# Altium footprint library Main_Board.PcbLib: 107 footprints (part 5 of 7)
Each footprint in its own frame and in the unit in brackets; x right, y up, seen from the top. Pads: shape width x height; smd on the part's side, far side on the other; paste and mask are expansions set on the pad; w line width, h text height; cw(c..) or ccw(c..) is an arc to the next point about the centre after c.
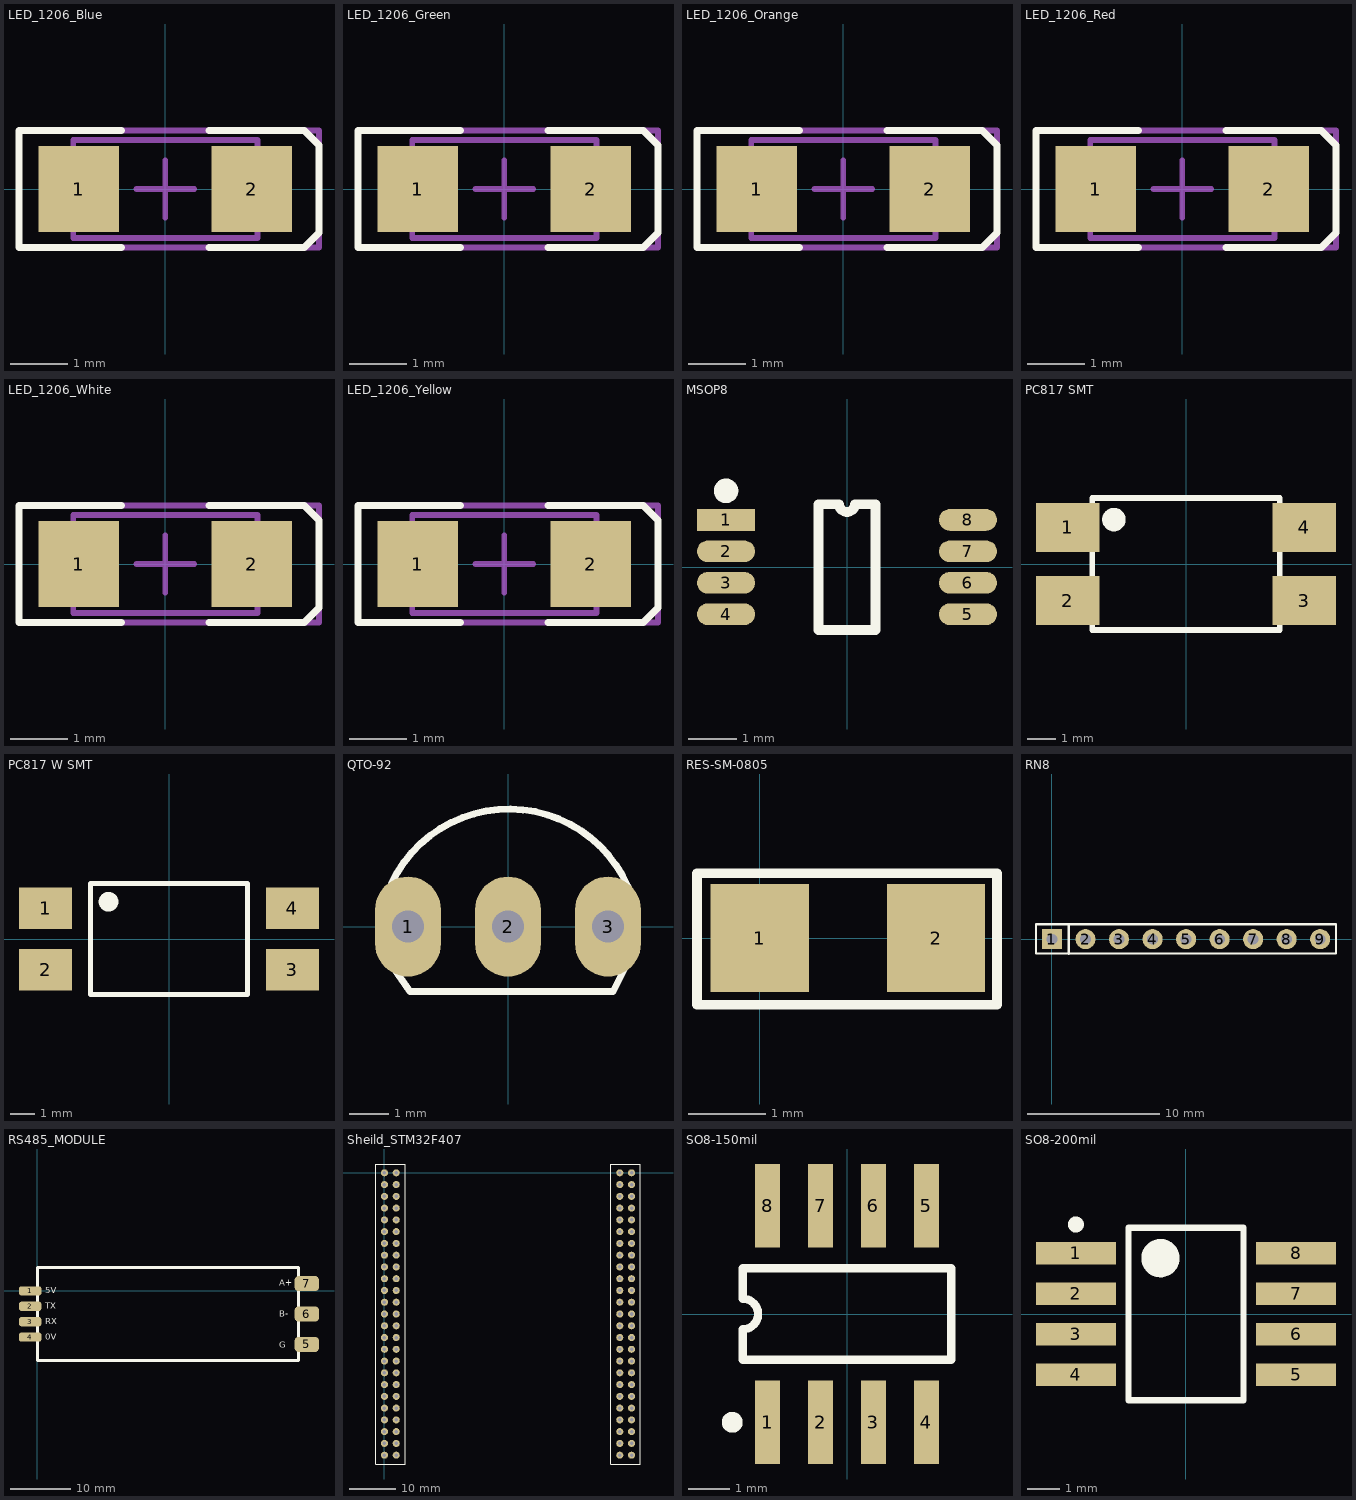
[diagram p4: the footprints below, top view; thin cyan lines are the x and y axes]

## LED_1206_Blue [mm] "Chip LED, 2-Leads, Body 3.2x1.6mm, IPC Medium Density"
height 0.69
pads (2):
  rect 1.4x1.5 smd: 1(-1.5,0) 2(1.5,0)
Top Overlay:
  lines w0.127: -0.762,-1.016 -2.54,-1.016 -2.54,1.016 -0.762,1.016 ; 0.762,-1.016 2.413,-1.016 2.667,-0.762 2.667,0.762 2.413,1.016 0.762,1.016
Mechanical 13:
  lines w0.1: -1.6,-0.85 -1.6,0.85 1.6,0.85 1.6,-0.85 -1.6,-0.85
Mechanical 15:
  lines w0.1: -0.5,0 0.5,0 ; 0,-0.5 0,0.5 ; -2.54,-1.016 -2.54,1.016 2.667,1.016 2.667,-1.016 -2.54,-1.016
3D body "User Library-led_1206-blue.step": height 1.1, standoff 0, extent -1.61,-0.8 1.61,0.8

## LED_1206_Green [mm] "Chip LED, 2-Leads, Body 3.2x1.6mm, IPC Medium Density"
height 0.69
pads (2):
  rect 1.4x1.5 smd: 1(-1.5,0) 2(1.5,0)
Top Overlay:
  lines w0.127: -0.762,-1.016 -2.54,-1.016 -2.54,1.016 -0.762,1.016 ; 0.762,-1.016 2.413,-1.016 2.667,-0.762 2.667,0.762 2.413,1.016 0.762,1.016
Mechanical 13:
  lines w0.1: -1.6,-0.85 1.6,-0.85 1.6,0.85 -1.6,0.85 -1.6,-0.85
Mechanical 15:
  lines w0.1: -0.5,0 0.5,0 ; 0,-0.5 0,0.5 ; -2.54,-1.016 2.667,-1.016 2.667,1.016 -2.54,1.016 -2.54,-1.016
3D body "User Library-led_1206-green.step": height 1.1, standoff 0, extent -1.61,-0.8 1.61,0.8

## LED_1206_Orange [mm] "Chip LED, 2-Leads, Body 3.2x1.6mm, IPC Medium Density"
height 0.69
pads (2):
  rect 1.4x1.5 smd: 1(-1.5,0) 2(1.5,0)
Top Overlay:
  lines w0.127: -0.762,-1.016 -2.54,-1.016 -2.54,1.016 -0.762,1.016 ; 0.762,-1.016 2.413,-1.016 2.667,-0.762 2.667,0.762 2.413,1.016 0.762,1.016
Mechanical 13:
  lines w0.1: -1.6,-0.85 1.6,-0.85 1.6,0.85 -1.6,0.85 -1.6,-0.85
Mechanical 15:
  lines w0.1: -0.5,0 0.5,0 ; 0,-0.5 0,0.5 ; -2.54,-1.016 2.667,-1.016 2.667,1.016 -2.54,1.016 -2.54,-1.016
3D body "User Library-led_1206-yellow.step": height 1.1, standoff 0, extent -1.61,-0.8 1.61,0.8

## LED_1206_Red [mm] "Chip LED, 2-Leads, Body 3.2x1.6mm, IPC Medium Density"
height 0.69
pads (2):
  rect 1.4x1.5 smd: 1(-1.5,0) 2(1.5,0)
Top Overlay:
  lines w0.127: -0.762,-1.016 -2.54,-1.016 -2.54,1.016 -0.762,1.016 ; 0.762,-1.016 2.413,-1.016 2.667,-0.762 2.667,0.762 2.413,1.016 0.762,1.016
Mechanical 13:
  lines w0.1: -1.6,-0.85 1.6,-0.85 1.6,0.85 -1.6,0.85 -1.6,-0.85
Mechanical 15:
  lines w0.1: -0.5,0 0.5,0 ; 0,-0.5 0,0.5 ; -2.54,-1.016 2.667,-1.016 2.667,1.016 -2.54,1.016 -2.54,-1.016
3D body "User Library-led_1206-red.step": height 1.1, standoff 0, extent -1.61,-0.8 1.61,0.8

## LED_1206_White [mm] "Chip LED, 2-Leads, Body 3.2x1.6mm, IPC Medium Density"
height 0.69
pads (2):
  rect 1.4x1.5 smd: 1(-1.5,0) 2(1.5,0)
Top Overlay:
  lines w0.127: -0.762,-1.016 -2.54,-1.016 -2.54,1.016 -0.762,1.016 ; 0.762,-1.016 2.413,-1.016 2.667,-0.762 2.667,0.762 2.413,1.016 0.762,1.016
Mechanical 13:
  lines w0.1: -1.6,-0.85 1.6,-0.85 1.6,0.85 -1.6,0.85 -1.6,-0.85
Mechanical 15:
  lines w0.1: -0.5,0 0.5,0 ; 0,-0.5 0,0.5 ; -2.54,-1.016 2.667,-1.016 2.667,1.016 -2.54,1.016 -2.54,-1.016
3D body "WL-SMCW_1206_LED.stp": height 0.68, standoff 0, extent -1.6,-0.8 1.6,0.8

## LED_1206_Yellow [mm] "Chip LED, 2-Leads, Body 3.2x1.6mm, IPC Medium Density"
height 0.69
pads (2):
  rect 1.4x1.5 smd: 1(-1.5,0) 2(1.5,0)
Top Overlay:
  lines w0.127: -0.762,-1.016 -2.54,-1.016 -2.54,1.016 -0.762,1.016 ; 0.762,-1.016 2.413,-1.016 2.667,-0.762 2.667,0.762 2.413,1.016 0.762,1.016
Mechanical 13:
  lines w0.1: -1.6,-0.85 1.6,-0.85 1.6,0.85 -1.6,0.85 -1.6,-0.85
Mechanical 15:
  lines w0.1: -0.5,0 0.5,0 ; 0,-0.5 0,0.5 ; -2.54,-1.016 2.667,-1.016 2.667,1.016 -2.54,1.016 -2.54,-1.016
3D body "User Library-led_1206-yellow.step": height 1.1, standoff 0, extent -1.61,-0.8 1.61,0.8

## MSOP8 [mm] "TPS77301DGK"
pads (8):
  rect 1.2x0.45 smd: 1(-2.5,0.975)
  oval 1.2x0.45 smd: 2(-2.5,0.325) 3(-2.5,-0.325) 4(-2.5,-0.975) 5(2.5,-0.975) 6(2.5,-0.325) 7(2.5,0.325) 8(2.5,0.975)
Top Overlay:
  circle w0.254: c-2.5,1.575 r0.127
  lines w0.2: -0.59,-1.3 -0.59,1.3 -0.162,1.3 ccw(c0,1.3) 0.162,1.3 0.59,1.3 0.59,-1.3 -0.59,-1.3
3D body "User Library-EMSOP-8 Natl Semi MUY08A.STEP": height 1.12, standoff 0.02, extent -2.45,-1.5 2.55,1.5

## PC817 SMT [mm] "SMT Gullwing Lead-Form"
pads (4):
  rect 2.2x1.7 smd: 1(-4.1,1.27) 2(-4.1,-1.27) 3(4.1,-1.27) 4(4.1,1.27)
Top Overlay:
  circle w0.406: c-2.5,1.54 r0.203
  lines w0.203: -3.25,-2.29 3.25,-2.29 3.25,2.29 -3.25,2.29 -3.25,-2.29
3D body "User Library-HCPL-181-1.STEP": height 2, standoff -0.1, extent -3.5,-1.8 3.5,1.8

## PC817 W SMT [mm] "Wide SMT Gullwing Lead-Form"
pads (4):
  rect 2.2x1.7 smd: 1(-5.1,1.27) 2(-5.1,-1.27) 3(5.1,-1.27) 4(5.1,1.27)
Top Overlay:
  circle w0.406: c-2.5,1.54 r0.203
  lines w0.203: -3.25,-2.29 3.25,-2.29 3.25,2.29 -3.25,2.29 -3.25,-2.29

## QTO-92 [mil] "TO-92"
height 200
pads (3):
  oval 66x100 hole 32: 1(-100,0) 2(0,0) 3(100,0)
Top Overlay:
  lines w7: -116.52,43.21 cw(c0.97,-12.43) 119.94,39.97 ; -115.34,-40.24 -98,-65 105,-65 118,-39
3D body "SW3dPS-TO92.STEP": height 245.04, standoff -199.79, extent -108.87,-63.56 108.87,97

## RES-SM-0805 [mil]
pads (2):
  rect 50x55 smd: 1(0,0) 2(90,0)
Top Overlay:
  lines w5: -32,-34 121,-34 121,33 -32,33 -32,-34
3D body "User Library-0805-1.step": height 10.45, standoff -9.24, extent 5.64,-25.21 84.38,24.01

## RN8 [mil] "R SIP8, 9 Pin"
height 200
pads (9):
  rect 60x60 hole 32: 1(0,0)
  round 60 hole 32: 2(100,0) 3(200,0) 4(300,0) 5(400,0) 6(500,0) 7(600,0) 8(700,0) 9(800,0)
Top Overlay:
  lines w7: 49.6,-43.1 49.6,43.6 ; -47.7,-43 847.4,-43 847.4,43.9 -47.7,43.9 -47.7,-43
3D body "SW3dPS-Resistor Networks-1.STEP": height 219.29, standoff -115.35, extent -42.91,-25.01 842.91,24.2

## RS485_MODULE [mm] "Module RS485 Batfun"
pads (7):
  rrect50% 3.683x1.5 smd: 1(-1.194,0) 2(-1.194,-2.54) 3(-1.194,-5.08) 4(-1.194,-7.62)
  rrect50% 4x2.5 smd: 5(44.346,-8.81) 6(44.346,-3.81) 7(44.346,1.19)
Top Overlay:
  lines w0.5: -0.025,-11.43 42.951,-11.43 42.951,3.81 -0.025,3.81 -0.025,-11.43
  text "0V" at 1.321,-8.052 h1.02
  text "RX" at 1.321,-5.503 h1.02
  text "TX" at 1.321,-2.955 h1.02
  text "5V" at 1.321,-0.406 h1.02
  text "G" at 39.776,-9.398 h1.02
  text "B-" at 39.776,-4.293 h1.02
  text "A+" at 39.776,0.813 h1.02

## Sheild_STM32F407 [mil] "STM32F Discovery"
pads (100):
  round 60 hole 30: 1(0,0) 2(100,0) 3(0,-100) 4(100,-100) 5(0,-200) 6(100,-200) 7(0,-300) 8(100,-300) 9(0,-400) 10(100,-400) 11(0,-500) 12(100,-500) 13(0,-600) 14(100,-600) 15(0,-700) 16(100,-700) 17(0,-800) 18(100,-800) 19(0,-900) 20(100,-900) 21(0,-1000) 22(100,-1000) 23(0,-1100) 24(100,-1100) 25(0,-1200) 26(100,-1200) 27(0,-1300) 28(100,-1300) 29(0,-1400) 30(100,-1400) 31(0,-1500) 32(100,-1500) 33(0,-1600) 34(100,-1600) 35(0,-1700) 36(100,-1700) 37(0,-1800) 38(100,-1800) 39(0,-1900) 40(100,-1900) 41(0,-2000) 42(100,-2000) 43(0,-2100) 44(100,-2100) 45(0,-2200) 46(100,-2200) 47(0,-2300) 48(100,-2300) 49(0,-2400) 50(100,-2400) 51(2000,0) 52(2100,0) 53(2000,-100) 54(2100,-100) 55(2000,-200) 56(2100,-200) 57(2000,-300) 58(2100,-300) 59(2000,-400) 60(2100,-400) 61(2000,-500) 62(2100,-500) 63(2000,-600) 64(2100,-600) 65(2000,-700) 66(2100,-700) 67(2000,-800) 68(2100,-800) 69(2000,-900) 70(2100,-900) 71(2000,-1000) 72(2100,-1000) 73(2000,-1100) 74(2100,-1100) 75(2000,-1200) 76(2100,-1200) 77(2000,-1300) 78(2100,-1300) 79(2000,-1400) 80(2100,-1400) 81(2000,-1500) 82(2100,-1500) 83(2000,-1600) 84(2100,-1600) 85(2000,-1700) 86(2100,-1700) 87(2000,-1800) 88(2100,-1800) 89(2000,-1900) 90(2100,-1900) 91(2000,-2000) 92(2100,-2000) 93(2000,-2100) 94(2100,-2100) 95(2000,-2200) 96(2100,-2200) 97(2000,-2300) 98(2100,-2300) 99(2000,-2400) 100(2100,-2400)
Top Overlay:
  lines w10: -75,-2475 -75,75 175,75 175,-2475 -75,-2475 ; 1925,-2475 1925,75 2175,75 2175,-2475 1925,-2475
3D body "stm30f4.SLDPRT": height 931.5, standoff 25.98, extent -227.37,-2647 2351.37,1391.04
3D body "User Library-Header2x5female2_54mm.step": height 334.65, standoff -125.98, extent 1950,-1950 2150,50
3D body "User Library-Header2x25 female2_54mm.step": height 334.65, standoff -125.98, extent 1950,-2450 2150,-1950
3D body "User Library-Header2x25 female2_54mm.step": height 334.65, standoff -125.98, extent -50,-2450 150,-1950
3D body "User Library-HeaderRangLuocKepThang2_54mm (1).step": height 334.65, standoff -125.98, extent -50,-1950 150,50

## SO8-150mil [mm] "Small Outline; 8 Leads; Body Width 3.9 mm; Pitch 1.27 mm"
height 1.75
pads (8):
  rect 0.6x2 smd: 1(-1.905,-2.6) 2(-0.635,-2.6) 3(0.635,-2.6) 4(1.905,-2.6) 5(1.905,2.6) 6(0.635,2.6) 7(-0.635,2.6) 8(-1.905,2.6)
Top Overlay:
  circle w0.25: c-2.755,-2.6 r0.125
  lines w0.2: -2.5,-1.1 2.5,-1.1 2.5,1.1 -2.5,1.1 -2.5,0.367 cw(c-2.5,0) -2.5,-0.367 -2.5,-1.1
3D body "so8-3.step": height 1.7, standoff 0, extent -2.5,-2.95 2.4,3.05

## SO8-200mil [mm] "8-Pin Plastic Medium Body Small Outline Package 1.27 mm Pitch, IPC Low Density"
height 2.04
pads (8):
  rect 2.5x0.7 smd: 1(-3.45,1.905) 2(-3.45,0.635) 3(-3.45,-0.635) 4(-3.45,-1.905) 5(3.45,-1.905) 6(3.45,-0.635) 7(3.45,0.635) 8(3.45,1.905)
Top Overlay:
  circle w0.25: c-3.45,2.805 r0.125
  circle w0.6: c-0.8,1.75 r0.3
  lines w0.2: -1.8,-2.7 -1.8,2.7 1.8,2.7 1.8,-2.7 -1.8,-2.7
3D body "so8-3.step": height 1.7, standoff 0, extent -3.05,-2.4 2.95,2.5